# Altium footprint library Mech.PcbLib: 75 footprints (part 1 of 5)
Each footprint in its own frame and in the unit in brackets; x right, y up, seen from the top. Pads: shape width x height; smd on the part's side, far side on the other; paste and mask are expansions set on the pad; w line width, h text height; cw(c..) or ccw(c..) is an arc to the next point about the centre after c.
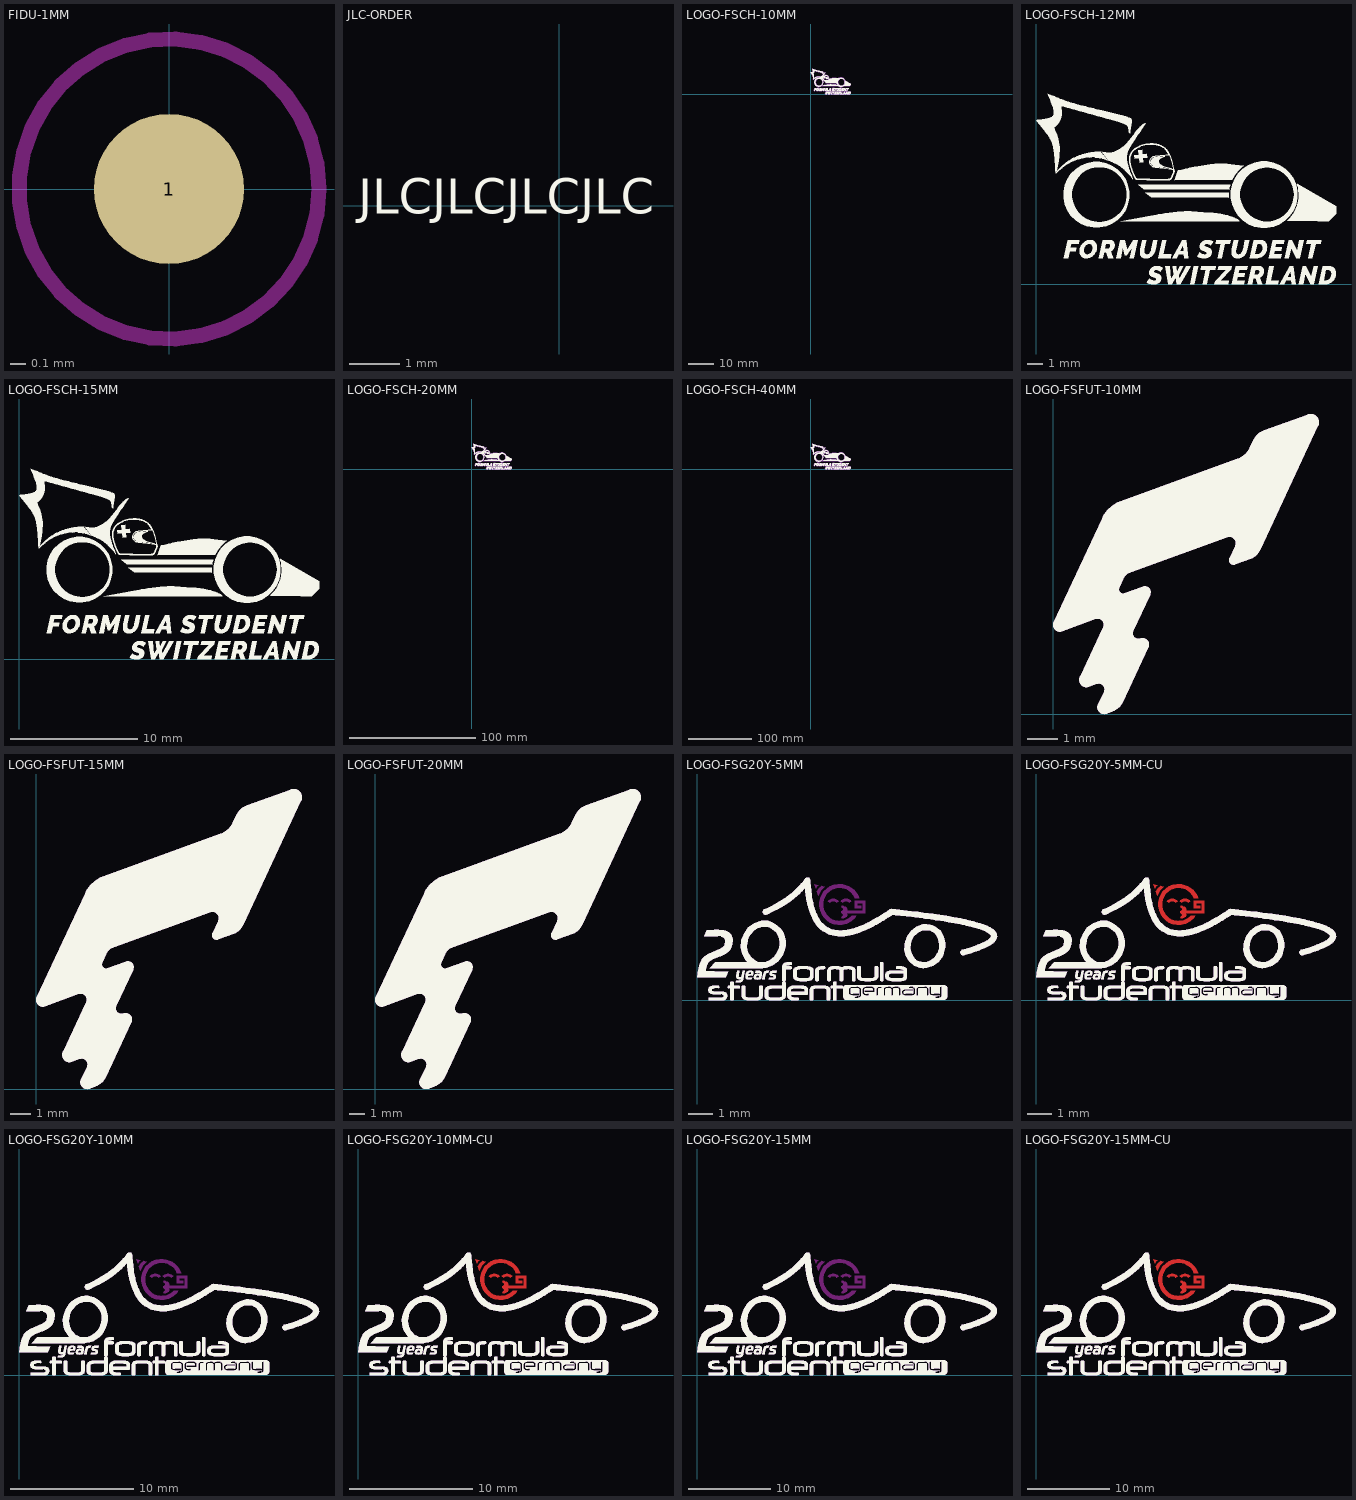
[diagram p0: the footprints below, top view; thin cyan lines are the x and y axes]

## FIDU-1MM [mm] "Fiducial 1mm"
pads (1):
  round 1 smd mask+0.5: 1(0,0)
Top Layer keep-out:
  circle w0.1: c0,0 r1

## JLC-ORDER [mm] "Placement of JLCPCB order number"
Top Overlay:
  text "JLCJLCJLCJLC" at -4.014,-0.384 h1.2

## LOGO-FSCH-10MM [mm]
Top Overlay:
  drawing of 37 lines, arcs and shapes, not listed
Top Assembly:
  drawing of 2151 lines, arcs and shapes, not listed
3D body: height 0.01, standoff 0, extent 7.251,5.452 10.873,6.321
3D body: height 0.01, standoff 0, extent 5.349,4.946 10.169,5.227
3D body: height 0.01, standoff 0, extent 10.196,2.957 13.678,6.438
3D body: height 0.01, standoff 0, extent 5.728,4.528 10.101,4.807
3D body: height 0.01, standoff 0, extent 13.144,3.306 15.704,5.256
3D body: height 0.01, standoff 0, extent 14.147,1.373 14.94,2.313
3D body: height 0.01, standoff 0, extent 9.398,1.373 10.191,2.313
3D body: height 0.01, standoff 0, extent 13.021,1.373 14.007,2.313
3D body: height 0.01, standoff 0, extent 12.186,1.373 13.004,2.313
3D body: height 0.01, standoff 0, extent 11.195,1.373 12.092,2.313
3D body: height 0.01, standoff 0, extent 8.429,1.362 9.281,2.321
3D body: height 0.01, standoff 0, extent 10.24,1.365 11.155,2.313
3D body: height 0.01, standoff 0, extent 14.8,0.006 15.697,0.946
3D body: height 0.01, standoff 0, extent 9.342,0.006 10.245,0.946
3D body: height 0.01, standoff 0, extent 12.759,0.006 13.6,0.946
3D body: height 0.01, standoff 0, extent 11.092,0.006 11.929,0.946
3D body: height 0.01, standoff 0, extent 8.62,0.006 9.414,0.946
3D body: height 0.01, standoff 0, extent 13.762,0.006 14.747,0.946
3D body: height 0.01, standoff 0, extent 12.021,0.006 12.703,0.946
3D body: height 0.01, standoff 0, extent 10.256,0.006 11.074,0.946
3D body: height 0.01, standoff 0, extent 8.063,0.006 8.48,0.946
3D body: height 0.01, standoff 0, extent 7.134,1.373 7.975,2.313
3D body: height 0.01, standoff 0, extent 4.432,3.302 10.64,3.82
3D body: height 0.01, standoff 0, extent 5.783,-0.005 6.635,0.954
3D body: height 0.01, standoff 0, extent 6.758,0.006 8.106,0.946
3D body: height 0.01, standoff 0, extent -0.005,5.805 5.009,9.989
3D body: height 0.01, standoff 0, extent 6.007,6.077 7.066,6.703
3D body: height 0.01, standoff 0, extent 4.87,5.452 7.251,7.378
3D body: height 0.01, standoff 0, extent 1.444,2.98 4.878,6.415
3D body: height 0.01, standoff 0, extent 5.145,6.367 5.819,7.041
3D body: height 0.01, standoff 0, extent 2.273,1.365 3.187,2.318
3D body: height 0.01, standoff 0, extent 3.279,1.373 4.116,2.313
3D body: height 0.01, standoff 0, extent 1.455,1.373 2.261,2.313
3D body: height 0.01, standoff 0, extent 4.208,1.373 5.322,2.313
3D body: height 0.01, standoff 0, extent 5.441,1.365 6.357,2.313
3D body: height 0.01, standoff 0, extent 6.396,1.373 7.079,2.313
3D body: height 0.01, standoff 0, extent 3.44,5.509 5.74,8.429

## LOGO-FSCH-12MM [mm]
Top Overlay:
  drawing of 37 lines, arcs and shapes, not listed
3D body: height 0, standoff 0, extent 12.314,0.01 13.296,1.138
3D body: height 0, standoff 0, extent 12.295,1.641 13.393,2.779
3D body: height 0, standoff 0, extent 15.319,0.01 16.328,1.138
3D body: height 0, standoff 0, extent 11.284,1.65 12.236,2.779
3D body: height 0, standoff 0, extent 11.217,0.01 12.301,1.138
3D body: height 0, standoff 0, extent 13.441,1.65 14.517,2.779
3D body: height 0, standoff 0, extent 13.317,0.01 14.322,1.138
3D body: height 0, standoff 0, extent 14.63,1.65 15.613,2.779
3D body: height 0, standoff 0, extent 15.633,1.65 16.816,2.779
3D body: height 0, standoff 0, extent 17.769,0.01 18.845,1.138
3D body: height 0, standoff 0, extent 14.433,0.01 15.252,1.138
3D body: height 0, standoff 0, extent 16.985,1.65 17.937,2.779
3D body: height 0, standoff 0, extent 16.522,0.01 17.705,1.138
3D body: height 0, standoff 0, extent 6.535,1.641 7.633,2.779
3D body: height 0, standoff 0, extent 4.132,6.615 6.893,10.12
3D body: height 0, standoff 0, extent 3.938,1.65 4.943,2.779
3D body: height 0, standoff 0, extent 1.749,1.65 2.717,2.779
3D body: height 0, standoff 0, extent -0.003,6.971 6.015,11.993
3D body: height 0, standoff 0, extent 2.731,1.641 3.829,2.786
3D body: height 0, standoff 0, extent 5.848,6.547 8.707,8.859
3D body: height 0, standoff 0, extent 6.179,7.645 6.988,8.454
3D body: height 0, standoff 0, extent 1.736,3.58 5.859,7.703
3D body: height 0, standoff 0, extent 5.054,1.65 6.391,2.779
3D body: height 0, standoff 0, extent 10.121,1.638 11.144,2.789
3D body: height 0, standoff 0, extent 9.681,0.01 10.182,1.138
3D body: height 0, standoff 0, extent 10.35,0.01 11.303,1.138
3D body: height 0, standoff 0, extent 7.681,1.65 8.5,2.779
3D body: height 0, standoff 0, extent 8.566,1.65 9.576,2.779
3D body: height 0, standoff 0, extent 8.115,0.01 9.733,1.138
3D body: height 0, standoff 0, extent 6.945,-0.003 7.967,1.148
3D body: height 0, standoff 0, extent 5.323,3.967 12.775,4.588
3D body: height 0, standoff 0, extent 6.878,5.438 12.127,5.773
3D body: height 0, standoff 0, extent 15.781,3.971 18.854,6.312
3D body: height 0, standoff 0, extent 12.242,3.552 16.421,7.731
3D body: height 0, standoff 0, extent 7.213,7.298 8.485,8.049
3D body: height 0, standoff 0, extent 8.707,6.547 13.055,7.59
3D body: height 0, standoff 0, extent 6.423,5.94 12.209,6.277

## LOGO-FSCH-15MM [mm]
Top Overlay:
  drawing of 37 lines, arcs and shapes, not listed
3D body: height 0, standoff 0, extent 8.685,-0.003 9.963,1.436
3D body: height 0, standoff 0, extent 12.943,0.013 14.134,1.424
3D body: height 0, standoff 0, extent 10.712,2.064 11.975,3.476
3D body: height 0, standoff 0, extent 9.605,2.064 10.629,3.476
3D body: height 0, standoff 0, extent 10.148,0.013 12.172,1.424
3D body: height 0, standoff 0, extent 12.106,0.013 12.732,1.424
3D body: height 0, standoff 0, extent 14.027,0.013 15.382,1.424
3D body: height 0, standoff 0, extent 14.11,2.064 15.301,3.476
3D body: height 0, standoff 0, extent 12.657,2.049 13.935,3.488
3D body: height 0, standoff 0, extent 8.032,7.428 15.267,7.85
3D body: height 0, standoff 0, extent 10.888,8.188 16.325,9.492
3D body: height 0, standoff 0, extent 9.02,9.126 10.611,10.066
3D body: height 0, standoff 0, extent 15.309,4.442 20.534,9.668
3D body: height 0, standoff 0, extent 19.734,4.967 23.577,7.893
3D body: height 0, standoff 0, extent 8.601,6.801 15.165,7.219
3D body: height 0, standoff 0, extent 6.656,4.961 15.975,5.738
3D body: height 0, standoff 0, extent 6.321,2.064 7.993,3.476
3D body: height 0, standoff 0, extent 7.727,9.561 8.738,10.572
3D body: height 0, standoff 0, extent 2.188,2.064 3.398,3.476
3D body: height 0, standoff 0, extent 7.314,8.188 10.888,11.078
3D body: height 0, standoff 0, extent 3.416,2.052 4.788,3.484
3D body: height 0, standoff 0, extent -0.003,8.718 7.522,14.998
3D body: height 0, standoff 0, extent 2.171,4.478 7.327,9.633
3D body: height 0, standoff 0, extent 4.925,2.064 6.182,3.476
3D body: height 0, standoff 0, extent 5.167,8.273 8.62,12.656
3D body: height 0, standoff 0, extent 8.172,2.052 9.545,3.476
3D body: height 0, standoff 0, extent 20.66,0.013 22.14,1.424
3D body: height 0, standoff 0, extent 15.374,2.052 16.748,3.476
3D body: height 0, standoff 0, extent 18.048,0.013 19.072,1.424
3D body: height 0, standoff 0, extent 18.295,2.064 19.523,3.476
3D body: height 0, standoff 0, extent 22.219,0.013 23.565,1.424
3D body: height 0, standoff 0, extent 19.549,2.064 21.028,3.476
3D body: height 0, standoff 0, extent 16.808,2.064 18.154,3.476
3D body: height 0, standoff 0, extent 16.653,0.013 17.909,1.424
3D body: height 0, standoff 0, extent 19.156,0.013 20.418,1.424
3D body: height 0, standoff 0, extent 21.239,2.064 22.43,3.476
3D body: height 0, standoff 0, extent 15.398,0.013 16.627,1.424

## LOGO-FSCH-20MM [mm]
Top Overlay:
  drawing of 37 lines, arcs and shapes, not listed
Top Assembly:
  drawing of 2151 lines, arcs and shapes, not listed
3D body: height 0.01, standoff 0, extent 6.9,11.046 11.51,16.898
3D body: height 0.01, standoff 0, extent 10.911,2.741 12.746,4.642
3D body: height 0.01, standoff 0, extent 8.44,2.757 10.673,4.642
3D body: height 0.01, standoff 0, extent 2.922,2.757 4.539,4.642
3D body: height 0.01, standoff 0, extent -0.003,11.64 10.044,20.025
3D body: height 0.01, standoff 0, extent 10.318,12.766 11.668,14.116
3D body: height 0.01, standoff 0, extent 12.044,12.185 14.168,13.44
3D body: height 0.01, standoff 0, extent 6.577,2.757 8.255,4.642
3D body: height 0.01, standoff 0, extent 4.562,2.741 6.394,4.653
3D body: height 0.01, standoff 0, extent 2.9,5.979 9.783,12.862
3D body: height 0.01, standoff 0, extent 9.766,10.933 14.538,14.792
3D body: height 0.01, standoff 0, extent 13.55,0.018 16.252,1.903
3D body: height 0.01, standoff 0, extent 11.596,-0.003 13.303,1.919
3D body: height 0.01, standoff 0, extent 12.825,2.757 14.192,4.642
3D body: height 0.01, standoff 0, extent 8.888,6.625 21.33,7.662
3D body: height 0.01, standoff 0, extent 14.304,2.757 15.989,4.642
3D body: height 0.01, standoff 0, extent 16.164,0.018 17,1.903
3D body: height 0.01, standoff 0, extent 20.56,0.018 22.2,1.903
3D body: height 0.01, standoff 0, extent 24.098,0.018 25.465,1.903
3D body: height 0.01, standoff 0, extent 27.586,0.018 29.56,1.903
3D body: height 0.01, standoff 0, extent 17.282,0.018 18.872,1.903
3D body: height 0.01, standoff 0, extent 22.235,0.018 23.912,1.903
3D body: height 0.01, standoff 0, extent 25.576,0.018 27.262,1.903
3D body: height 0.01, standoff 0, extent 18.728,0.018 20.539,1.903
3D body: height 0.01, standoff 0, extent 29.667,0.018 31.464,1.903
3D body: height 0.01, standoff 0, extent 20.528,2.741 22.362,4.642
3D body: height 0.01, standoff 0, extent 16.9,2.736 18.606,4.658
3D body: height 0.01, standoff 0, extent 22.442,2.757 24.239,4.642
3D body: height 0.01, standoff 0, extent 24.427,2.757 26.067,4.642
3D body: height 0.01, standoff 0, extent 26.102,2.757 28.077,4.642
3D body: height 0.01, standoff 0, extent 18.84,2.757 20.43,4.642
3D body: height 0.01, standoff 0, extent 28.358,2.757 29.948,4.642
3D body: height 0.01, standoff 0, extent 26.348,6.632 31.479,10.54
3D body: height 0.01, standoff 0, extent 11.485,9.081 20.248,9.64
3D body: height 0.01, standoff 0, extent 20.44,5.932 27.417,12.909
3D body: height 0.01, standoff 0, extent 10.725,9.919 20.385,10.482
3D body: height 0.01, standoff 0, extent 14.538,10.933 21.797,12.674

## LOGO-FSCH-40MM [mm]
Top Overlay:
  drawing of 37 lines, arcs and shapes, not listed
Top Assembly:
  drawing of 2151 lines, arcs and shapes, not listed
3D body: height 0.01, standoff 0, extent 13.765,22.033 22.959,33.703
3D body: height 0.01, standoff 0, extent 25.581,5.505 28.307,9.263
3D body: height 0.01, standoff 0, extent 21.765,5.473 25.422,9.263
3D body: height 0.01, standoff 0, extent 16.837,5.505 21.288,9.263
3D body: height 0.01, standoff 0, extent 5.833,5.505 9.057,9.263
3D body: height 0.01, standoff 0, extent 13.121,5.505 16.467,9.263
3D body: height 0.01, standoff 0, extent 9.104,5.473 12.756,9.284
3D body: height 0.01, standoff 0, extent 20.581,25.462 23.273,28.155
3D body: height 0.01, standoff 0, extent 5.789,11.929 19.515,25.655
3D body: height 0.01, standoff 0, extent 19.48,21.807 28.996,29.503
3D body: height 0.01, standoff 0, extent 24.024,24.305 28.258,26.808
3D body: height 0.01, standoff 0, extent 0,23.218 20.035,39.938
3D body: height 0.01, standoff 0, extent 27.026,0.042 32.414,3.8
3D body: height 0.01, standoff 0, extent 23.13,0 26.534,3.832
3D body: height 0.01, standoff 0, extent 17.731,13.216 42.541,15.285
3D body: height 0.01, standoff 0, extent 28.529,5.505 31.89,9.263
3D body: height 0.01, standoff 0, extent 32.24,0.042 33.907,3.8
3D body: height 0.01, standoff 0, extent 41.005,0.042 44.276,3.8
3D body: height 0.01, standoff 0, extent 48.06,0.042 50.786,3.8
3D body: height 0.01, standoff 0, extent 55.015,0.042 58.953,3.8
3D body: height 0.01, standoff 0, extent 34.468,0.042 37.638,3.8
3D body: height 0.01, standoff 0, extent 44.344,0.042 47.69,3.8
3D body: height 0.01, standoff 0, extent 51.008,0.042 54.369,3.8
3D body: height 0.01, standoff 0, extent 37.353,0.042 40.962,3.8
3D body: height 0.01, standoff 0, extent 59.164,0.042 62.748,3.8
3D body: height 0.01, standoff 0, extent 40.941,5.473 44.598,9.263
3D body: height 0.01, standoff 0, extent 33.706,5.462 37.109,9.295
3D body: height 0.01, standoff 0, extent 44.757,5.505 48.341,9.263
3D body: height 0.01, standoff 0, extent 48.716,5.505 51.987,9.263
3D body: height 0.01, standoff 0, extent 52.056,5.505 55.994,9.263
3D body: height 0.01, standoff 0, extent 37.575,5.505 40.745,9.263
3D body: height 0.01, standoff 0, extent 56.555,5.505 59.725,9.263
3D body: height 0.01, standoff 0, extent 52.547,13.232 62.778,21.024
3D body: height 0.01, standoff 0, extent 22.908,18.115 40.384,19.229
3D body: height 0.01, standoff 0, extent 40.767,11.836 54.679,25.748
3D body: height 0.01, standoff 0, extent 21.394,19.785 40.656,20.907
3D body: height 0.01, standoff 0, extent 28.996,21.807 43.472,25.279

## LOGO-FSFUT-10MM [mm]
Top Overlay:
  drawing of 1 lines, arcs and shapes, not listed
Top Assembly:
  drawing of 1 lines, arcs and shapes, not listed

## LOGO-FSFUT-15MM [mm]
Top Overlay:
  drawing of 1 lines, arcs and shapes, not listed
Top Assembly:
  drawing of 1 lines, arcs and shapes, not listed

## LOGO-FSFUT-20MM [mm]
Top Overlay:
  drawing of 1 lines, arcs and shapes, not listed
Top Assembly:
  drawing of 1 lines, arcs and shapes, not listed

## LOGO-FSG20Y-5MM [mm] "Source: https://www.formulastudent.de/pr/logos /  / Terms of use / Nutzungsbedingungen /  / \"Formula Student\" is registered trademark. The FSG logos are also subject to international copyright laws.  /  / EN: The right to use the FSG logo in an appropriate context is reserved to the teams, to the sponsors of the FSG event and to the press reporting on FSG. Other parties including the teams' sponsors are not allowed to use the FSG logo for any purpose. /  / DE: Teams, Sponsoren des FSG-Wettbewerb und Presse, die über die FSG berichtet, dürfen das FSG-Logo im entsprechenden Kontext frei verwenden. Anderen, die Sponsoren der Teams eingeschlossen, ist die Verwendung des FSG-Logos nicht gestattet."
Top Layer keep-out:
  region: 4.778,4.735 4.951,4.688 4.937,4.673 4.909,4.64 4.883,4.606 4.858,4.572 4.846,4.554
  region: 4.954,4.264 4.891,4.431 4.909,4.462 4.949,4.522 4.992,4.579 5.04,4.633 5.065,4.658 5.214,4.618 5.173,4.581 5.097,4.5 5.032,4.411 4.977,4.315
  region: 5.142,3.901 5.145,3.835 5.171,3.705 5.222,3.582 5.296,3.472 5.389,3.378 5.5,3.305 5.622,3.254 5.752,3.228 5.819,3.225 5.818,3.226 5.886,3.23 6.019,3.257 6.144,3.31 6.256,3.388 6.306,3.434 6.507,3.434 6.449,3.35 6.298,3.214 6.118,3.119 5.92,3.07 5.819,3.07 5.737,3.07 5.576,3.102 5.424,3.165 5.288,3.256 5.172,3.372 5.081,3.508 5.018,3.659 4.986,3.82 4.986,3.902 4.986,3.984 5.018,4.145 5.081,4.296 5.172,4.432 5.288,4.548 5.424,4.639 5.576,4.702 5.737,4.734 5.819,4.734 5.95,4.734 6.2,4.653 6.413,4.499 6.569,4.287 6.61,4.162 6.443,4.162 6.398,4.25 6.272,4.403 6.107,4.513 5.918,4.57 5.819,4.578 5.752,4.574 5.622,4.549 5.5,4.498 5.389,4.424 5.296,4.33 5.222,4.22 5.171,4.098 5.145,3.968
  region: 5.335,4.025 5.417,3.962 5.418,3.962 5.446,3.992 5.518,4.028 5.599,4.028 5.671,3.992 5.699,3.962 5.782,4.025 5.742,4.078 5.624,4.137 5.492,4.137 5.374,4.078
  region: 5.855,4.025 5.938,3.962 5.966,3.992 6.038,4.028 6.119,4.028 6.191,3.992 6.219,3.962 6.302,4.025 6.262,4.078 6.144,4.137 6.012,4.137 5.894,4.078
  region: 400 vertices and 0 holes, not listed, extent 5.882,3.33 6.858,4.058
Top Overlay:
  drawing of 25 lines, arcs and shapes, not listed
Top Solder:
  drawing of 6 lines, arcs and shapes, not listed
Top Assembly:
  drawing of 25 lines, arcs and shapes, not listed

## LOGO-FSG20Y-5MM-CU [mm] "Source: https://www.formulastudent.de/pr/logos /  / Terms of use / Nutzungsbedingungen /  / \"Formula Student\" is registered trademark. The FSG logos are also subject to international copyright laws.  /  / EN: The right to use the FSG logo in an appropriate context is reserved to the teams, to the sponsors of the FSG event and to the press reporting on FSG. Other parties including the teams' sponsors are not allowed to use the FSG logo for any purpose. /  / DE: Teams, Sponsoren des FSG-Wettbewerb und Presse, die über die FSG berichtet, dürfen das FSG-Logo im entsprechenden Kontext frei verwenden. Anderen, die Sponsoren der Teams eingeschlossen, ist die Verwendung des FSG-Logos nicht gestattet."
Top Layer:
  region: 4.778,4.735 4.951,4.688 4.937,4.673 4.909,4.64 4.883,4.606 4.858,4.572 4.846,4.554
  region: 4.954,4.264 4.891,4.431 4.909,4.462 4.949,4.522 4.992,4.579 5.04,4.633 5.065,4.658 5.214,4.618 5.173,4.581 5.097,4.5 5.032,4.411 4.977,4.315
  region: 5.142,3.901 5.145,3.835 5.171,3.705 5.222,3.582 5.296,3.472 5.389,3.378 5.5,3.305 5.622,3.254 5.752,3.228 5.819,3.225 5.818,3.226 5.886,3.23 6.019,3.257 6.144,3.31 6.256,3.388 6.306,3.434 6.507,3.434 6.449,3.35 6.298,3.214 6.118,3.119 5.92,3.07 5.819,3.07 5.737,3.07 5.576,3.102 5.424,3.165 5.288,3.256 5.172,3.372 5.081,3.508 5.018,3.659 4.986,3.82 4.986,3.902 4.986,3.984 5.018,4.145 5.081,4.296 5.172,4.432 5.288,4.548 5.424,4.639 5.576,4.702 5.737,4.734 5.819,4.734 5.95,4.734 6.2,4.653 6.413,4.499 6.569,4.287 6.61,4.162 6.443,4.162 6.398,4.25 6.272,4.403 6.107,4.513 5.918,4.57 5.819,4.578 5.752,4.574 5.622,4.549 5.5,4.498 5.389,4.424 5.296,4.33 5.222,4.22 5.171,4.098 5.145,3.968
  region: 5.335,4.025 5.417,3.962 5.418,3.962 5.446,3.992 5.518,4.028 5.599,4.028 5.671,3.992 5.699,3.962 5.782,4.025 5.742,4.078 5.624,4.137 5.492,4.137 5.374,4.078
  region: 5.855,4.025 5.938,3.962 5.966,3.992 6.038,4.028 6.119,4.028 6.191,3.992 6.219,3.962 6.302,4.025 6.262,4.078 6.144,4.137 6.012,4.137 5.894,4.078
  region: 400 vertices and 0 holes, not listed, extent 5.882,3.33 6.858,4.058
Top Overlay:
  drawing of 25 lines, arcs and shapes, not listed
Top Solder:
  drawing of 6 lines, arcs and shapes, not listed
Top Assembly:
  drawing of 25 lines, arcs and shapes, not listed

## LOGO-FSG20Y-10MM [mm] "Source: https://www.formulastudent.de/pr/logos /  / Terms of use / Nutzungsbedingungen /  / \"Formula Student\" is registered trademark. The FSG logos are also subject to international copyright laws.  /  / EN: The right to use the FSG logo in an appropriate context is reserved to the teams, to the sponsors of the FSG event and to the press reporting on FSG. Other parties including the teams' sponsors are not allowed to use the FSG logo for any purpose. /  / DE: Teams, Sponsoren des FSG-Wettbewerb und Presse, die über die FSG berichtet, dürfen das FSG-Logo im entsprechenden Kontext frei verwenden. Anderen, die Sponsoren der Teams eingeschlossen, ist die Verwendung des FSG-Logos nicht gestattet."
Top Layer keep-out:
  region: 9.54,9.471 9.886,9.378 9.858,9.346 9.803,9.281 9.75,9.214 9.7,9.145 9.676,9.109
  region: 9.891,8.531 9.767,8.864 9.802,8.926 9.881,9.045 9.968,9.159 10.063,9.267 10.114,9.317 10.411,9.238 10.329,9.164 10.178,9.002 10.047,8.824 9.938,8.632
  region: 10.267,7.806 10.274,7.674 10.325,7.414 10.427,7.169 10.574,6.949 10.761,6.762 10.981,6.615 11.226,6.514 11.486,6.462 11.618,6.456 11.617,6.458 11.753,6.465 12.019,6.52 12.269,6.626 12.492,6.781 12.591,6.874 12.992,6.874 12.878,6.706 12.575,6.435 12.216,6.244 11.821,6.146 11.618,6.146 11.454,6.146 11.133,6.21 10.831,6.335 10.559,6.517 10.328,6.749 10.146,7.021 10.02,7.323 9.957,7.644 9.957,7.808 9.957,7.971 10.02,8.292 10.146,8.595 10.328,8.867 10.559,9.098 10.831,9.28 11.133,9.405 11.454,9.469 11.618,9.469 11.749,9.469 12.006,9.428 12.255,9.348 12.487,9.23 12.699,9.077 12.884,8.893 13.038,8.682 13.157,8.45 13.198,8.326 12.866,8.326 12.824,8.416 12.722,8.586 12.595,8.74 12.448,8.873 12.283,8.983 12.104,9.067 11.914,9.124 11.717,9.153 11.618,9.157 11.486,9.15 11.226,9.099 10.981,8.997 10.761,8.85 10.574,8.663 10.427,8.443 10.326,8.198 10.274,7.939
  region: 10.652,8.053 10.817,7.928 10.819,7.928 10.874,7.987 11.018,8.06 11.179,8.06 11.323,7.987 11.379,7.928 11.545,8.053 11.506,8.106 11.406,8.189 11.29,8.247 11.163,8.277 11.033,8.277 10.907,8.247 10.79,8.189 10.691,8.106
  region: 11.69,8.053 11.856,7.928 11.857,7.928 11.913,7.987 12.057,8.06 12.218,8.06 12.362,7.987 12.418,7.928 12.583,8.053 12.544,8.106 12.445,8.189 12.328,8.247 12.202,8.277 12.072,8.277 11.945,8.247 11.829,8.189 11.729,8.106
  region: 403 vertices and 0 holes, not listed, extent 11.746,6.665 13.694,8.12
Top Overlay:
  drawing of 25 lines, arcs and shapes, not listed
Top Solder:
  drawing of 6 lines, arcs and shapes, not listed
Top Assembly:
  drawing of 25 lines, arcs and shapes, not listed

## LOGO-FSG20Y-10MM-CU [mm] "Source: https://www.formulastudent.de/pr/logos /  / Terms of use / Nutzungsbedingungen /  / \"Formula Student\" is registered trademark. The FSG logos are also subject to international copyright laws.  /  / EN: The right to use the FSG logo in an appropriate context is reserved to the teams, to the sponsors of the FSG event and to the press reporting on FSG. Other parties including the teams' sponsors are not allowed to use the FSG logo for any purpose. /  / DE: Teams, Sponsoren des FSG-Wettbewerb und Presse, die über die FSG berichtet, dürfen das FSG-Logo im entsprechenden Kontext frei verwenden. Anderen, die Sponsoren der Teams eingeschlossen, ist die Verwendung des FSG-Logos nicht gestattet."
Top Layer:
  region: 403 vertices and 0 holes, not listed, extent 11.746,6.665 13.694,8.12
  region: 11.69,8.053 11.856,7.928 11.857,7.928 11.913,7.987 12.057,8.06 12.218,8.06 12.362,7.987 12.418,7.928 12.583,8.053 12.544,8.106 12.445,8.189 12.328,8.247 12.202,8.277 12.072,8.277 11.945,8.247 11.829,8.189 11.729,8.106
  region: 10.652,8.053 10.817,7.928 10.819,7.928 10.874,7.987 11.018,8.06 11.179,8.06 11.323,7.987 11.379,7.928 11.545,8.053 11.506,8.106 11.406,8.189 11.29,8.247 11.163,8.277 11.033,8.277 10.907,8.247 10.79,8.189 10.691,8.106
  region: 10.267,7.806 10.274,7.674 10.325,7.414 10.427,7.169 10.574,6.949 10.761,6.762 10.981,6.615 11.226,6.514 11.486,6.462 11.618,6.456 11.617,6.458 11.753,6.465 12.019,6.52 12.269,6.626 12.492,6.781 12.591,6.874 12.992,6.874 12.878,6.706 12.575,6.435 12.216,6.244 11.821,6.146 11.618,6.146 11.454,6.146 11.133,6.21 10.831,6.335 10.559,6.517 10.328,6.749 10.146,7.021 10.02,7.323 9.957,7.644 9.957,7.808 9.957,7.971 10.02,8.292 10.146,8.595 10.328,8.867 10.559,9.098 10.831,9.28 11.133,9.405 11.454,9.469 11.618,9.469 11.749,9.469 12.006,9.428 12.255,9.348 12.487,9.23 12.699,9.077 12.884,8.893 13.038,8.682 13.157,8.45 13.198,8.326 12.866,8.326 12.824,8.416 12.722,8.586 12.595,8.74 12.448,8.873 12.283,8.983 12.104,9.067 11.914,9.124 11.717,9.153 11.618,9.157 11.486,9.15 11.226,9.099 10.981,8.997 10.761,8.85 10.574,8.663 10.427,8.443 10.326,8.198 10.274,7.939
  region: 9.891,8.531 9.767,8.864 9.802,8.926 9.881,9.045 9.968,9.159 10.063,9.267 10.114,9.317 10.411,9.238 10.329,9.164 10.178,9.002 10.047,8.824 9.938,8.632
  region: 9.54,9.471 9.886,9.378 9.858,9.346 9.803,9.281 9.75,9.214 9.7,9.145 9.676,9.109
Top Overlay:
  drawing of 25 lines, arcs and shapes, not listed
Top Solder:
  drawing of 6 lines, arcs and shapes, not listed
Top Assembly:
  drawing of 25 lines, arcs and shapes, not listed

## LOGO-FSG20Y-15MM [mm] "Source: https://www.formulastudent.de/pr/logos /  / Terms of use / Nutzungsbedingungen /  / \"Formula Student\" is registered trademark. The FSG logos are also subject to international copyright laws.  /  / EN: The right to use the FSG logo in an appropriate context is reserved to the teams, to the sponsors of the FSG event and to the press reporting on FSG. Other parties including the teams' sponsors are not allowed to use the FSG logo for any purpose. /  / DE: Teams, Sponsoren des FSG-Wettbewerb und Presse, die über die FSG berichtet, dürfen das FSG-Logo im entsprechenden Kontext frei verwenden. Anderen, die Sponsoren der Teams eingeschlossen, ist die Verwendung des FSG-Logos nicht gestattet."
Top Layer keep-out:
  region: 14.302,14.206 14.821,14.068 14.778,14.02 14.696,13.922 14.617,13.821 14.542,13.718 14.505,13.665
  region: 14.829,12.798 14.642,13.297 14.695,13.39 14.814,13.569 14.944,13.74 15.086,13.901 15.163,13.976 15.608,13.858 15.485,13.747 15.259,13.505 15.062,13.237 14.898,12.949
  region: 15.393,11.711 15.402,11.513 15.48,11.123 15.631,10.757 15.852,10.427 16.133,10.146 16.463,9.925 16.83,9.773 17.219,9.696 17.418,9.687 17.416,9.691 17.619,9.701 18.018,9.782 18.393,9.942 18.728,10.174 18.877,10.313 19.477,10.313 19.392,10.188 19.192,9.959 18.966,9.757 18.717,9.583 18.449,9.441 18.165,9.333 17.871,9.26 17.569,9.223 17.418,9.223 17.172,9.223 16.691,9.318 16.238,9.506 15.83,9.779 15.483,10.126 15.21,10.534 15.022,10.987 14.927,11.468 14.927,11.713 14.927,11.959 15.022,12.44 15.21,12.893 15.483,13.301 15.83,13.648 16.238,13.921 16.691,14.109 17.172,14.204 17.418,14.204 17.613,14.204 18,14.143 18.372,14.022 18.721,13.845 19.038,13.616 19.315,13.34 19.546,13.024 19.725,12.677 19.786,12.491 19.288,12.491 19.225,12.626 19.072,12.881 18.883,13.11 18.662,13.31 18.415,13.475 18.145,13.602 17.861,13.688 17.566,13.731 17.418,13.736 17.219,13.726 16.83,13.649 16.463,13.497 16.133,13.277 15.852,12.996 15.632,12.666 15.48,12.299 15.403,11.91
  region: 15.969,12.082 16.217,11.895 16.219,11.895 16.258,11.941 16.351,12.019 16.46,12.074 16.578,12.102 16.7,12.102 16.818,12.074 16.927,12.019 17.02,11.941 17.059,11.895 17.308,12.082 17.249,12.16 17.1,12.285 16.926,12.373 16.736,12.418 16.541,12.418 16.351,12.373 16.177,12.285 16.027,12.16
  region: 17.525,12.082 17.774,11.895 17.776,11.895 17.815,11.941 17.908,12.019 18.017,12.074 18.135,12.102 18.257,12.102 18.375,12.074 18.484,12.019 18.577,11.941 18.616,11.895 18.864,12.082 18.806,12.16 18.657,12.285 18.482,12.373 18.292,12.418 18.097,12.418 17.908,12.373 17.733,12.285 17.584,12.16
  region: 410 vertices and 0 holes, not listed, extent 17.609,10 20.529,12.181
Top Overlay:
  drawing of 25 lines, arcs and shapes, not listed
Top Solder:
  drawing of 6 lines, arcs and shapes, not listed
Top Assembly:
  drawing of 25 lines, arcs and shapes, not listed

## LOGO-FSG20Y-15MM-CU [mm] "Source: https://www.formulastudent.de/pr/logos /  / Terms of use / Nutzungsbedingungen /  / \"Formula Student\" is registered trademark. The FSG logos are also subject to international copyright laws.  /  / EN: The right to use the FSG logo in an appropriate context is reserved to the teams, to the sponsors of the FSG event and to the press reporting on FSG. Other parties including the teams' sponsors are not allowed to use the FSG logo for any purpose. /  / DE: Teams, Sponsoren des FSG-Wettbewerb und Presse, die über die FSG berichtet, dürfen das FSG-Logo im entsprechenden Kontext frei verwenden. Anderen, die Sponsoren der Teams eingeschlossen, ist die Verwendung des FSG-Logos nicht gestattet."
Top Layer:
  region: 14.302,14.206 14.821,14.068 14.778,14.02 14.696,13.922 14.617,13.821 14.542,13.718 14.505,13.665
  region: 14.829,12.798 14.642,13.297 14.695,13.39 14.814,13.569 14.944,13.74 15.086,13.901 15.163,13.976 15.608,13.858 15.485,13.747 15.259,13.505 15.062,13.237 14.898,12.949
  region: 15.393,11.711 15.402,11.513 15.48,11.123 15.631,10.757 15.852,10.427 16.133,10.146 16.463,9.925 16.83,9.773 17.219,9.696 17.418,9.687 17.416,9.691 17.619,9.701 18.018,9.782 18.393,9.942 18.728,10.174 18.877,10.313 19.477,10.313 19.392,10.188 19.192,9.959 18.966,9.757 18.717,9.583 18.449,9.441 18.165,9.333 17.871,9.26 17.569,9.223 17.418,9.223 17.172,9.223 16.691,9.318 16.238,9.506 15.83,9.779 15.483,10.126 15.21,10.534 15.022,10.987 14.927,11.468 14.927,11.713 14.927,11.959 15.022,12.44 15.21,12.893 15.483,13.301 15.83,13.648 16.238,13.921 16.691,14.109 17.172,14.204 17.418,14.204 17.613,14.204 18,14.143 18.372,14.022 18.721,13.845 19.038,13.616 19.315,13.34 19.546,13.024 19.725,12.677 19.786,12.491 19.288,12.491 19.225,12.626 19.072,12.881 18.883,13.11 18.662,13.31 18.415,13.475 18.145,13.602 17.861,13.688 17.566,13.731 17.418,13.736 17.219,13.726 16.83,13.649 16.463,13.497 16.133,13.277 15.852,12.996 15.632,12.666 15.48,12.299 15.403,11.91
  region: 15.969,12.082 16.217,11.895 16.219,11.895 16.258,11.941 16.351,12.019 16.46,12.074 16.578,12.102 16.7,12.102 16.818,12.074 16.927,12.019 17.02,11.941 17.059,11.895 17.308,12.082 17.249,12.16 17.1,12.285 16.926,12.373 16.736,12.418 16.541,12.418 16.351,12.373 16.177,12.285 16.027,12.16
  region: 17.525,12.082 17.774,11.895 17.776,11.895 17.815,11.941 17.908,12.019 18.017,12.074 18.135,12.102 18.257,12.102 18.375,12.074 18.484,12.019 18.577,11.941 18.616,11.895 18.864,12.082 18.806,12.16 18.657,12.285 18.482,12.373 18.292,12.418 18.097,12.418 17.908,12.373 17.733,12.285 17.584,12.16
  region: 410 vertices and 0 holes, not listed, extent 17.609,10 20.529,12.181
Top Overlay:
  drawing of 25 lines, arcs and shapes, not listed
Top Solder:
  drawing of 6 lines, arcs and shapes, not listed
Top Assembly:
  drawing of 25 lines, arcs and shapes, not listed